# Altium footprint library custom.PcbLib: 330 footprints (part 11 of 21)
Each footprint in its own frame and in the unit in brackets; x right, y up, seen from the top. Pads: shape width x height; smd on the part's side, far side on the other; paste and mask are expansions set on the pad; w line width, h text height; cw(c..) or ccw(c..) is an arc to the next point about the centre after c.
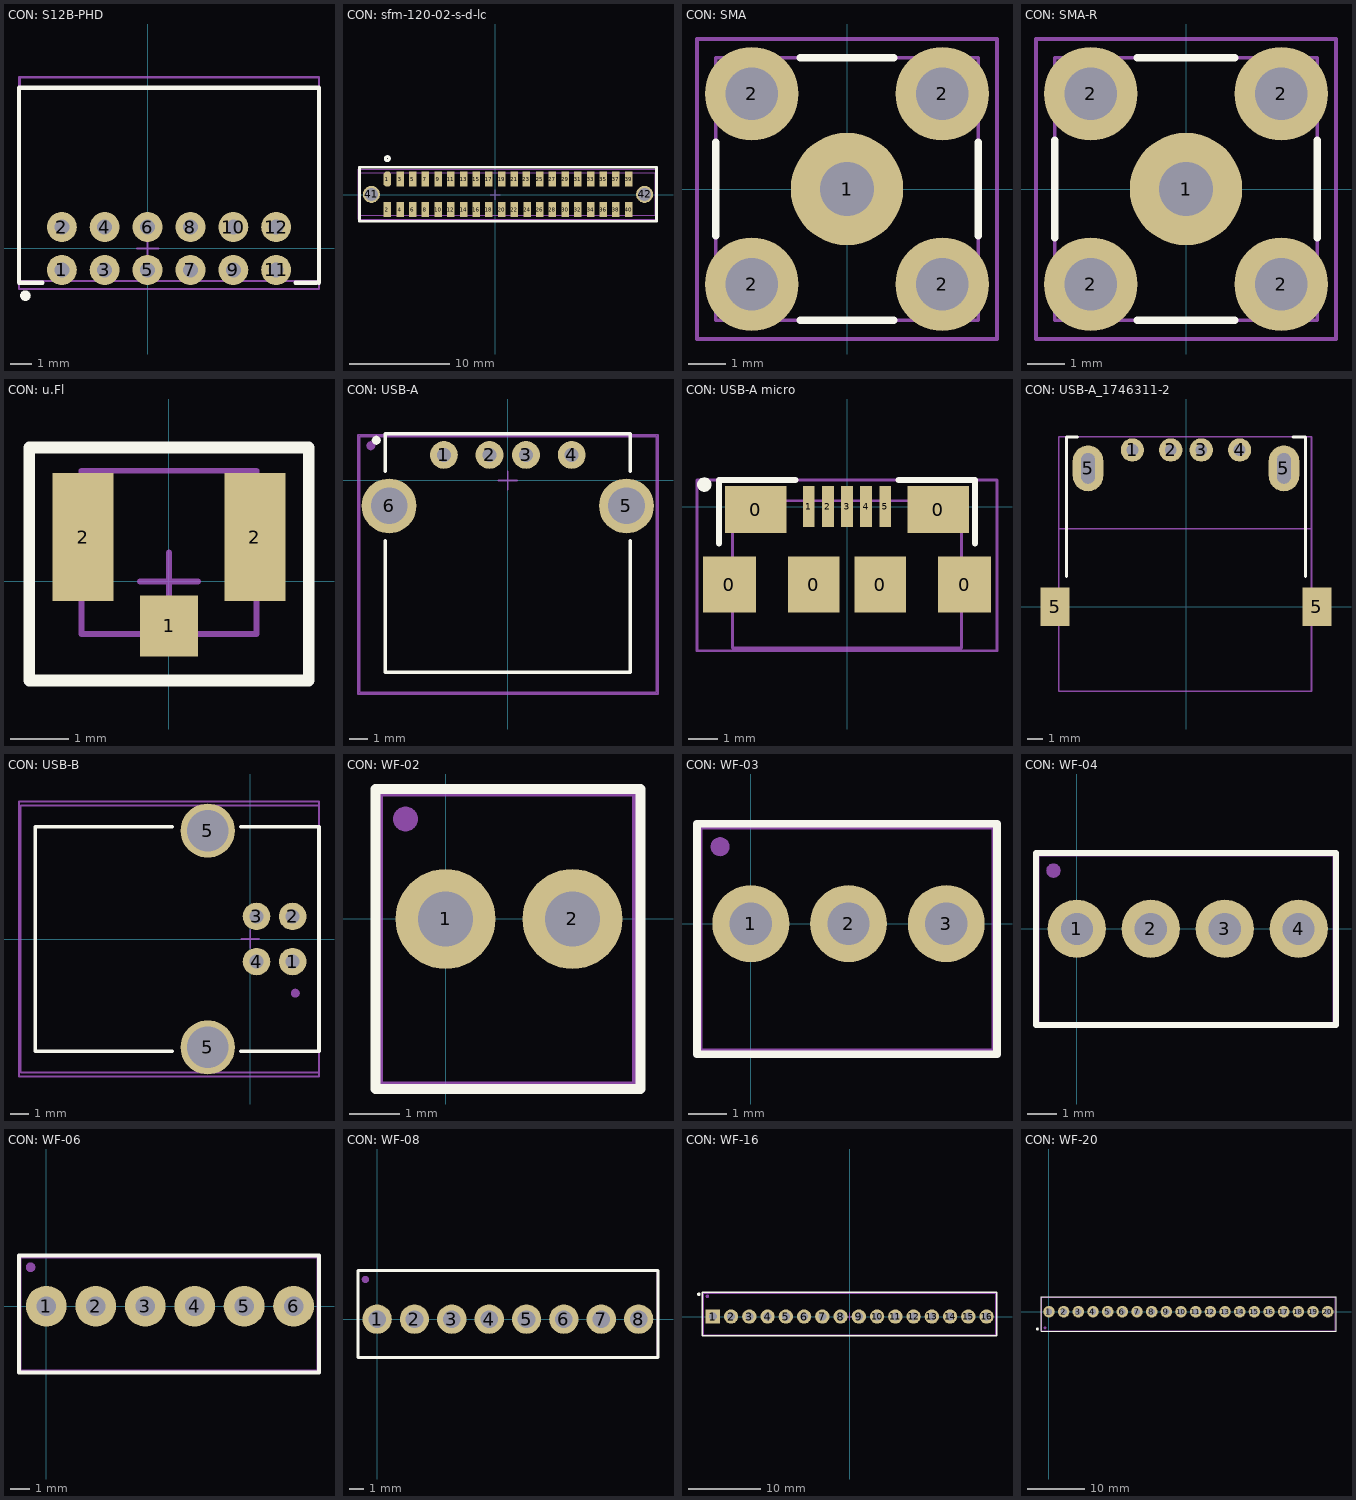
[diagram p10: the footprints below, top view; thin cyan lines are the x and y axes]

## CON: S12B-PHD [mm]
pads (13):
  round 1.4 hole 0.7: 1(-4,-1) 2(-4,1) 3(-2,-1) 4(-2,1) 5(0,-1) 6(0,1) 7(2,-1) 8(2,1) 9(4,-1) 10(4,1) 11(6,-1) 12(6,1)
  round 0.5 on Top Overlay: ""(-5.7,-2.2)
Top Overlay:
  lines w0.2: -4.9,-1.6 -5.9,-1.6 -6,-1.6 -6,7.5 8,7.5 8,-1.6 ; 6.9,-1.6 7.9,-1.6
Top Assy:
  lines w0.1: -5.95,-1.525 8,-1.525 8,7.975 -5.95,7.975 -5.95,-1.525
Size Area:
  lines w0.1: -0.5,0 0.5,0 ; 0,-0.5 0,0.5 ; -6,-1.9 -6,8 8,8 8,-1.9 -6,-1.9
3D body "S12B-PHDSS.STEP": height 5, standoff 0, extent -5.95,-1.525 7.95,7.975

## CON: sfm-120-02-s-d-lc [mm]
height 10
pads (42):
  oct 0.75x1.5 smd: 1(-10.8,1.55)
  rect 0.75x1.5 smd: 2(-10.8,-1.5) 3(-9.53,1.55) 4(-9.53,-1.5) 5(-8.26,1.55) 6(-8.26,-1.5) 7(-6.99,1.55) 8(-6.99,-1.5) 9(-5.72,1.55) 10(-5.72,-1.5) 11(-4.45,1.55) 12(-4.45,-1.5) 13(-3.18,1.55) 14(-3.18,-1.5) 15(-1.91,1.55) 16(-1.91,-1.5) 17(-0.64,1.55) 18(-0.64,-1.5) 19(0.63,1.55) 20(0.63,-1.5) 21(1.9,1.55) 22(1.9,-1.5) 23(3.11,1.55) 24(3.17,-1.5) 25(4.44,1.55) 26(4.44,-1.5) 27(5.71,1.55) 28(5.71,-1.5) 29(6.98,1.55) 30(6.98,-1.5) 31(8.25,1.55) 32(8.25,-1.5) 33(9.52,1.55) 34(9.52,-1.5) 35(10.79,1.55) 36(10.79,-1.5) 37(12.06,1.55) 38(12.06,-1.5) 39(13.33,1.55) 40(13.33,-1.5)
  round 1.7 hole 1.3: 41(-12.39,0.025) 42(14.92,0.025)
Top Overlay:
  circle w0.3: c-10.8,3.6 r0.2
  lines w0.254: -13.585,-2.675 16.115,-2.675 16.115,2.725 -13.585,2.725 -13.585,-2.675
Top Assy:
  lines w0.1: -13.435,-2.075 -13.435,2.2 15.965,2.2 15.965,-2.075 -13.435,-2.075
Size Area:
  lines w0.05: -13.735,-2.475 16.265,-2.475 16.265,2.525 -13.735,2.525 -13.735,-2.475
  lines w0.1: -0.5,-0.03 0.5,-0.03 ; 0,-0.53 0,0.47
3D body "SFM-120-02-L-D-LC-TR.stp": height 4.72, standoff -1.5, extent -13.403,-2.07 15.934,2.184

## CON: SMA [mm]
pads (5):
  round 3 hole 1.45: 1(0,0)
  round 2.5 hole 1.4: 2(-2.54,-2.54) 2(-2.54,2.54) 2(2.54,-2.54) 2(2.54,2.54)
Top Overlay:
  lines w0.2: -3.5,-1.25 -3.5,1.25 ; -1.25,-3.5 1.25,-3.5 ; -1.25,3.5 1.25,3.5 ; 3.5,-1.25 3.5,1.25
Top Assy:
  lines w0.1: -3.5,-3.5 3.5,-3.5 3.5,3.5 -3.5,3.5 -3.5,-3.5
Size Area:
  lines w0.1: -0.5,0 0.5,0 ; 0,-0.5 0,0.5 ; -4,-4 -4,4 4,4 4,-4 -4,-4
3D body "SMA_connector.STEP": height 9.53, standoff -3.94, extent -3.5,-3.5 3.5,3.5

## CON: SMA-R [mm]
pads (5):
  round 3 hole 1.45: 1(0,0)
  round 2.5 hole 1.4: 2(-2.54,-2.54) 2(-2.54,2.54) 2(2.54,-2.54) 2(2.54,2.54)
Top Overlay:
  lines w0.2: -3.5,-1.3 -3.5,1.3 ; -1.3,-3.5 1.3,-3.5 ; -1.3,3.5 1.3,3.5 ; 3.5,-1.3 3.5,1.3
Top Assy:
  lines w0.1: -3.5,-3.5 3.5,-3.5 3.5,3.5 -3.5,3.5 -3.5,-3.5
Size Area:
  lines w0.1: -0.5,0 0.5,0 ; 0,-0.5 0,0.5 ; -4,-4 -4,4 4,4 4,-4 -4,-4
3D body "Samtec-SMA-J-P-H-RA-TH1.STEP": height 10.26, standoff -3.84, extent -3.5,-3.5 3.5,11.6

## CON: u.Fl [mm]
height 1.5
pads (3):
  rect 1x1.05 smd: 1(0,-0.763)
  rect 1.05x2.2 smd: 2(-1.475,0.763) 2(1.475,0.763)
Top Overlay:
  lines w0.2: -2.4,-1.7 2.4,-1.7 2.4,2.3 -2.4,2.3 -2.4,-1.7
Top Assy:
  lines w0.1: -1.5,-0.9 1.5,-0.9 1.5,1.9 -1.5,1.9 -1.5,-0.9
Size Area:
  lines w0.1: -0.5,0 0.5,0 ; 0,-0.5 0,0.5 ; -2.4,-1.7 -2.4,2.3 2.4,2.3 2.4,-1.7 -2.4,-1.7
3D body "IPX.step": height 1.27, standoff -0.01, extent -1.5,-0.95 1.5,1.9

## CON: USB-A [mm]
height 5
pads (8):
  round 1.524 hole 0.762: 1(-3.5,1.397) 2(-1,1.397) 3(1,1.397) 4(3.5,1.397)
  round 3 hole 2: 5(6.5,-1.397) 6(-6.5,-1.397)
  round 0.5 on Mech1: ""(-7.5,1.9)
  round 0.5 on Top Overlay: ""(-7.2,2.2)
Top Overlay:
  lines w0.2: -6.7,-3.294 -6.7,-10.5 6.7,-10.5 6.7,-3.294 ; -6.7,0.5 -6.7,2.55 6.7,2.55 6.7,0.5
Top Assy:
  lines w0.1: -8.105,-11.593 8.129,-11.593 8.129,2.407 -8.105,2.407 -8.105,-11.593
Size Area:
  lines w0.1: -0.5,0 0.5,0 ; 0,-0.5 0,0.5 ; -8.2,-11.7 8.225,-11.7 8.225,2.5 -8.2,2.5 -8.2,-11.7
3D body "USB_A_PCB.STEP": height 7.66, standoff -3.62, extent -8.105,-11.593 8.129,2.407

## CON: USB-A micro [mm]
height 5
pads (12):
  rect 1.8x1.9 smd: 0(-4,-2.65) 0(4,-2.65)
  rect 2.1x1.6 smd: 0(-3.1,-0.1) 0(3.1,-0.1)
  rect 1.75x1.9 smd: 0(-1.125,-2.65) 0(1.125,-2.65)
  rect 0.4x1.4 smd: 1(-1.3,0) 2(-0.65,0) 3(0,0) 4(0.65,0) 5(1.3,0)
  round 0.5 on Top Overlay: ""(-4.85,0.75)
Top Overlay:
  lines w0.2: -4.35,-1.25 -4.35,0.9 -1.75,0.9 ; 1.75,0.9 4.35,0.9 4.35,-1.25
Top Assy:
  lines w0.1: -3.9,-4.8 3.9,-4.8 3.9,0.2 -3.9,0.2 -3.9,-4.8
Size Area:
  lines w0.1: -5.1,-4.9 5.1,-4.9 5.1,0.9 -5.1,0.9 -5.1,-4.9
3D body "User Library-micro usb SMD.STEP": height 2.68, standoff -0.02, extent -3.9,-4.8 3.9,0.2

## CON: USB-A_1746311-2 [mm]
pads (8):
  round 1.524 hole 0.762: 1(-3.5,10.25) 2(-1,10.25) 3(1,10.25) 4(3.5,10.25)
  rect 1.9x2.5 smd: 5(-8.55,0) 5(8.55,0)
  oval 2x3 hole 0.9 slot 2 at 90 deg: 5(-6.4,9.05) 5(6.4,9.05)
Top Overlay:
  lines w0.2: -7.8,2 -7.8,11.1 -7.1,11.1 ; 7,11.1 7.8,11.1 7.8,2
Top Assy:
  lines w0.1: -8.3,5.1 8.2,5.1 ; -8.3,-5.5 -8.3,-1 -8.3,1 -8.3,11.1 8.2,11.1 8.2,1 8.2,-1 8.2,-5.5 -8.3,-5.5
3D body "c-1746311-2-g1-3d.stp": height 4.1, standoff -4.52, extent -8.25,-5.45 8.25,11.05

## CON: USB-B [mm] "USB-B connector on PCB"
height 12
pads (7):
  round 1.524 hole 0.762: 1(2.35,-1.25) 2(2.35,1.25) 3(0.35,1.25) 4(0.35,-1.25)
  round 3 hole 2.3: 5(-2.35,-6) 5(-2.35,6)
  round 0.5 on Mech1: ""(2.5,-3)
Top Overlay:
  lines w0.2: -4.318,-6.223 -11.9,-6.223 -11.9,6.223 -4.318,6.223 ; -0.508,-6.223 3.81,-6.223 3.81,6.223 -0.508,6.223
Top Assy:
  lines w0.1: -12.708,-7.399 -12.708,7.4 3.792,7.4 3.792,-7.399 -12.708,-7.399
Size Area:
  lines w0.1: -0.5,0 0.5,0 ; 0,-0.5 0,0.5 ; -12.8,-7.62 3.81,-7.62 3.81,7.62 -12.8,7.62 -12.8,-7.62
3D body "USB-B-S-X-W-TH.STEP": height 11, standoff -3.64, extent -12.708,-7.398 3.792,7.4

## CON: WF-02 [mm]
pads (3):
  round 2 hole 1.1: 1(0,0) 2(2.54,0)
  round 0.5 on Mech1: ""(-0.8,2)
Top Overlay:
  lines w0.2: -1.4,-3.4 3.9,-3.4 3.9,2.6 -1.4,2.6 -1.4,-3.4
Top Assy:
  lines w0.1: -1.3,-3.3 -1.3,2.5 3.78,2.5 3.78,-3.3 -1.3,-3.3
3D body "User Library-WF-02.STEP": height 11.5, standoff -3.3, extent -1.3,-3.3 3.78,2.5

## CON: WF-03 [mm]
pads (4):
  round 2 hole 1.1: 1(0,0) 2(2.54,0) 3(5.08,0)
  round 0.5 on Mech1: ""(-0.8,2)
Top Overlay:
  lines w0.2: -1.4,-3.4 -1.4,2.6 6.4,2.6 6.4,-3.4 -1.4,-3.4
Top Assy:
  lines w0.1: -1.31,-3.3 -1.31,2.5 6.31,2.5 6.31,-3.3 -1.31,-3.3
3D body "User Library-WF-03.STEP": height 11.5, standoff -3.3, extent -1.31,-3.3 6.31,2.5

## CON: WF-04 [mm]
pads (5):
  round 2 hole 1.1: 1(0,0) 2(2.54,0) 3(5.08,0) 4(7.62,0)
  round 0.5 on Mech1: ""(-0.8,2)
Top Overlay:
  lines w0.2: -1.4,-3.3 -1.4,2.6 8.9,2.6 8.9,-3.3 -1.4,-3.3
Top Assy:
  lines w0.1: -1.33,-3.273 -1.33,2.527 8.83,2.527 8.83,-3.273 -1.33,-3.273
3D body "User Library-WF-04.STEP": height 11.66, standoff -3.14, extent -1.33,-3.273 8.83,2.527

## CON: WF-06 [mm]
pads (7):
  round 2.1 hole 1: 1(0,0) 2(2.54,0) 3(5.08,0) 4(7.62,0) 5(10.16,0) 6(12.7,0)
  round 0.5 on Mech1: ""(-0.8,2)
Top Overlay:
  lines w0.2: -1.4,-3.4 -1.4,2.6 14,2.6 14,-3.4 -1.4,-3.4
Top Assy:
  lines w0.1: -1.32,-3.3 -1.32,2.5 13.92,2.5 13.92,-3.3 -1.32,-3.3
3D body "User Library-WF-06.STEP": height 11.5, standoff -3.3, extent -1.32,-3.3 13.92,2.5

## CON: WF-08 [mm]
pads (9):
  round 2 hole 1.2: 1(0,0) 2(2.54,0) 3(5.08,0) 4(7.62,0) 5(10.16,0) 6(12.7,0) 7(15.24,0) 8(17.78,0)
  round 0.5 on Mech1: ""(-0.8,2.7)
Top Overlay:
  lines w0.2: -1.3,-2.6 19.1,-2.6 19.1,3.3 -1.3,3.3 -1.3,-2.6
Top Assy:
  lines w0.1: -1.27,-2.54 -1.27,3.26 19.05,3.26 19.05,-2.54 -1.27,-2.54
3D body "User Library-WF-8.STEP": height 11.4, standoff -3.4, extent -1.27,-2.54 19.05,3.26

## CON: WF-16 [mm]
height 10
pads (18):
  rect 2x2 hole 1.1: 1(-19.05,0)
  round 2 hole 1.1: 2(-16.51,0) 3(-13.97,0) 4(-11.43,0) 5(-8.89,0) 6(-6.35,0) 7(-3.81,0) 8(-1.27,0) 9(1.27,0) 10(3.81,0) 11(6.35,0) 12(8.89,0) 13(11.43,0) 14(13.97,0) 15(16.51,0) 16(19.05,0)
  round 0.5 on Top Overlay: ""(-21,3.1)
  round 0.5 on Mech1: ""(-19.8,2.8)
Top Overlay:
  lines w0.2: -20.5,-2.7 20.5,-2.7 20.5,3.4 -20.5,3.4 -20.5,-2.7
Top Assy:
  lines w0.1: -20.32,-2.54 -20.32,3.26 20.32,3.26 20.32,-2.54 -20.32,-2.54
Size Area:
  lines w0.1: -0.5,0 0.5,0 ; 0,-0.5 0,0.5 ; -20.4,-2.6 -20.4,3.3 20.4,3.3 20.4,-2.6 -20.4,-2.6
3D body "User Library-WF-8.STEP": height 11.4, standoff -3.4, extent -20.32,-2.54 0,3.26
3D body "User Library-WF-8.STEP": height 11.4, standoff -3.4, extent 0,-2.54 20.32,3.26

## CON: WF-20 [mm]
pads (22):
  round 0.5 on Top Overlay: 0(-2,-3)
  round 2 hole 1.1: 1(0,0) 2(2.54,0) 3(5.08,0) 4(7.62,0) 5(10.16,0) 6(12.7,0) 7(15.24,0) 8(17.78,0) 9(20.32,0) 10(22.86,0) 11(25.4,0) 12(27.94,0) 13(30.48,0) 14(33.02,0) 15(35.56,0) 16(38.1,0) 17(40.64,0) 18(43.18,0) 19(45.72,0) 20(48.26,0)
  round 0.5 on Mech1: ""(-0.7,-2.8)
Top Overlay:
  lines w0.2: -1.35,-3.4 49.7,-3.4 49.7,2.6 -1.35,2.6 -1.35,-3.4
Top Assy:
  lines w0.1: -1.24,-3.3 49.6,-3.3 49.6,2.5 -1.24,2.5 -1.24,-3.3
3D body "WF-20.stp": height 11.51, standoff -3.29, extent -1.24,-3.3 49.6,2.5